# Altium footprint library Udemy_Library.PcbLib: 35 footprints (part 1 of 3)
Each footprint in its own frame and in the unit in brackets; x right, y up, seen from the top. Pads: shape width x height; smd on the part's side, far side on the other; paste and mask are expansions set on the pad; w line width, h text height; cw(c..) or ccw(c..) is an arc to the next point about the centre after c.
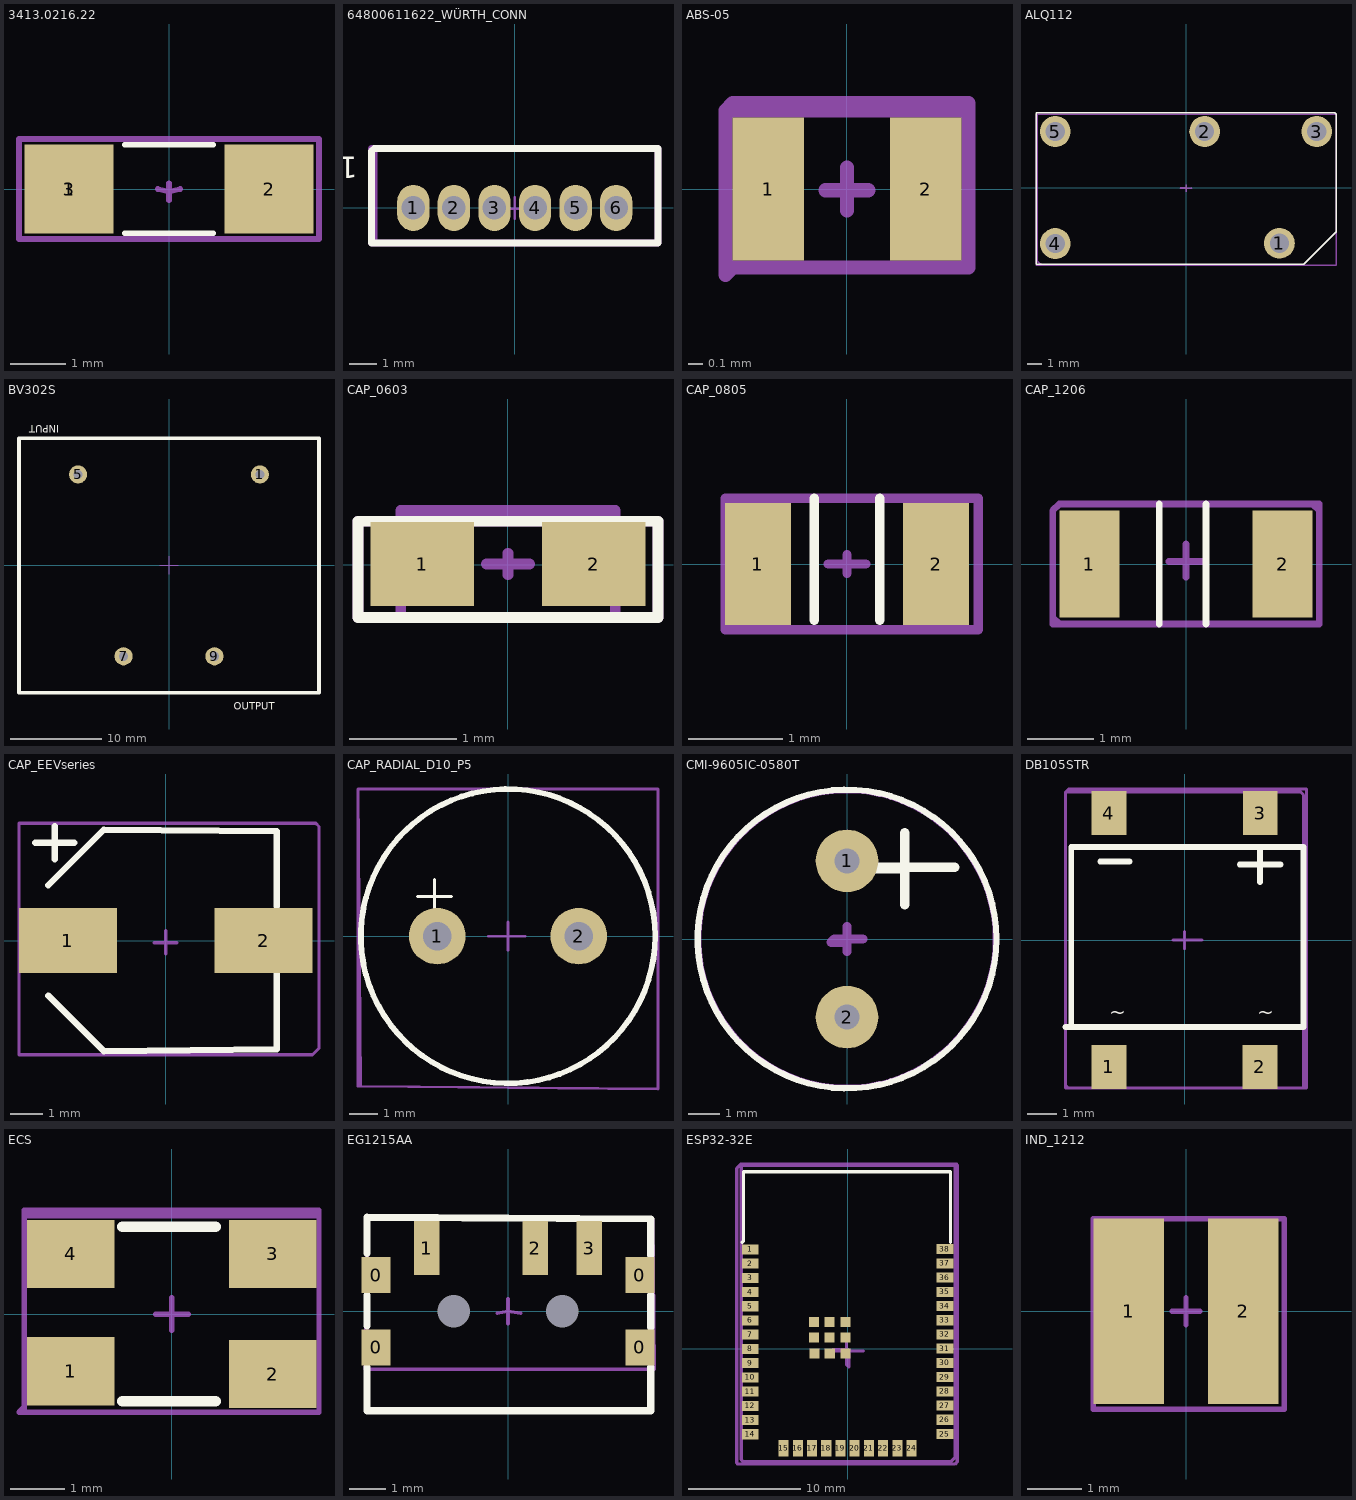
[diagram p0: the footprints below, top view; thin cyan lines are the x and y axes]

## 3413.0216.22 [mm]
pads (3):
  rect 1.6x1.6 smd mask+0.05: 1(-1.8,0) 2(1.8,0)
  rect 0.8x1 all layers, no hole mask+0.05: 3(-1.8,0)
Top Overlay:
  lines w0.1: -0.8,-0.8 0.8,-0.8 ; -0.8,0.8 0.8,0.8
Top Component Center:
  lines w0.1: 0,0.1 0,-0.2 0,-0.05 ; 0.2,0 0,-0.05 ; 0,-0.05 -0.2,0 0,-0.05 ; -2.7,-0.9 -2.7,0.9 2.7,0.9 2.7,-0.9 -2.7,-0.9
Top Designator:
  lines w0.1: -2.7,-0.9 2.7,-0.9 2.7,0.9 -2.7,0.9 -2.7,-0.9
  text ".Designator" at -1.6,-0.333 h0.5
3D body "FUSE-3413.0216.22.STEP": height 0.6, standoff 0, extent -1.6,-0.8 1.6,0.8

## 64800611622_WÜRTH_CONN [mm]
pads (6):
  oval 1.2x1.7 hole 0.87 mask+0.05: 1(-3.75,0) 2(-2.25,0) 3(-0.75,0) 4(0.75,0) 5(2.25,0) 6(3.75,0)
Top Overlay:
  lines w0.25: -5.3,-1.3 -5.3,2.1 -5.2,2.2 5.3,2.2 5.3,-1.3 -5.3,-1.3
  text "1" at -5.8,1.9 h0.8
Top Component Center:
  lines w0.1: -0.394,-0.027 0.406,-0.027 ; 0,-0.4 0,0.4
  lines w0.25: -5.3,-1.3 -5.2,-1.2 -5.2,-0.35 -5.2,1.35 -5.2,2.2 5.3,2.2 5.3,-1.3 -5.3,-1.3
Top Designator:
  lines w0.25: -5.3,-1.3 5.3,-1.3 5.3,2.2 -5.3,2.2 -5.3,-1.3
  text ".Designator" at -2.9,0.767 h0.8
3D body "64800611622 _würth_connector.stp": height 2.25, standoff -4.95, extent -5.25,-1.3 5.25,2.2

## ABS-05 [mm]
pads (2):
  rect 0.5x1 smd mask+0.05: 1(-0.55,0) 2(0.55,0)
Top Component Center:
  lines w0.1: -0.151,-0.01 0.149,-0.01 ; 0,-0.15 0,0.15 ; -0.85,-0.6 -0.85,0.55 0.8,0.55 0.85,0.6 0.85,-0.55 -0.8,-0.55 -0.85,-0.6
Top Designator:
  lines w0.1: -0.85,-0.55 0.85,-0.55 0.85,0.6 -0.8,0.6 -0.85,0.55 -0.85,-0.55
  text ".Designator" at -0.65,0.033 h0.4
3D body "ABS05-32.768KHZ-T.STEP": height 0.5, standoff 0, extent -0.8,-0.5 0.8,0.5

## ALQ112 [mm]
pads (5):
  round 2.1 hole 1.3 mask+0.05: 1(6.35,-3.79) 2(1.27,3.81) 3(8.89,3.81) 4(-8.89,-3.81) 5(-8.89,3.81)
Top Overlay:
  lines w0.1: -10.2,-5.2 -10.2,5.1 10.1,5.1 10.2,5 10.2,-3 8,-5.2 -10.2,-5.2
Top Component Center:
  lines w0.1: 0,0.2 0,-0.3 0,-0.05 ; 0.4,0 0.35,-0.05 0,-0.05 ; 0,-0.05 -0.35,-0.05 -0.4,0 -0.05,0 0,-0.05 ; -10.1,-5 -9.8,-5.3 10.2,-5.3 10.2,5 -10.1,5 -10.1,-5
Top Designator:
  lines w0.1: -10.2,-5.3 10.2,-5.3 10.2,5 -10.1,5 -10.2,4.9 -10.2,-5.3
  text ".Designator" at -0.2,-0.133 h0.5
3D body: height 0.45, standoff -3.75, extent -9.29,-4.21 -8.49,-3.41
3D body: height 0.45, standoff -3.75, extent -9.29,3.41 -8.49,4.21
3D body: height 15.6, standoff 0.4, extent 7.785,-3.44 9.26,-2.94
3D body: height 15.6, standoff 0.4, extent -9.99,-5.09 10.01,4.91
3D body: height 0.2, standoff -4, extent 1.064,3.709 1.476,3.911
3D body: height 0.2, standoff -4, extent 6.144,-3.911 6.556,-3.709
3D body: height 0.2, standoff -4, extent 8.684,3.709 9.096,3.911

## BV302S [mm]
pads (4):
  round 2 hole 1 mask+0.05: 1(10,10) 5(-10,10) 7(-5,-10) 9(5,-10)
Top Overlay:
  lines w0.4: -16.5,-14 -16.5,14 16.5,14 16.5,-14 -16.5,-14
  text "INPUT" at -12.1,15.4 h0.8
  text "OUTPUT" at 7.1,-15.9 h0.8
Top Component Center:
  lines w0.1: 0,1 0,-1 0,0 ; 1,0 0,0 ; 0,0 -1,0 0,0 ; -16.5,-14 16.5,-14 16.5,14 -16.5,14 -16.5,-14
Top Designator:
  lines w0.1: -16.5,-14 16.5,-14 16.5,14 -16.5,14 -16.5,-14
  text ".Designator" at -0.9,-0.633 h0.8
3D body "BV30XXXX028.step": height 29.75, standoff -3.5, extent -16.4,-13.9 16.4,13.9

## CAP_0603 [mil]
pads (2):
  rect 38x31 smd mask+1.97: 1(-31.46,0.21) 2(31.54,0.21)
Top Overlay:
  lines w3.94: -55.08,-19.48 -55.08,15.96 55.16,15.96 55.16,-19.48 -55.08,-19.48
Top 3D Body:
  lines w3.94: -39.33,-19.48 39.41,-19.48 39.41,19.89 -39.33,19.89 -39.33,-19.48
Top Component Center:
  lines w3.94: 0.04,4.14 0.04,-3.73 0.04,0.21 ; 7.91,0.21 0.04,0.21 ; 0.04,0.21 -7.84,0.21 0.04,0.21 ; -55.08,-19.48 -55.08,15.96 55.16,15.96 55.16,-19.48 -55.08,-19.48
Top Designator:
  lines w3.94: -55.08,-19.48 -55.08,15.96 55.16,15.96 55.16,-19.48 -55.08,-19.48
  text ".Designator" at -7.84,-15.54 h11.81
3D body "CAPC0603.STEP": height 31.5, standoff 0, extent -42.14,-21.43 40.57,19.07

## CAP_0805 [mm]
pads (2):
  rect 0.7x1.3 smd mask+0.05: 1(-0.95,0) 2(0.95,0)
Top Overlay:
  lines w0.1: -0.35,-0.6 -0.35,0.7 ; 0.35,-0.6 0.35,0.7
Top Component Center:
  lines w0.1: -0.2,0 0.2,0 0,0 0,-0.1 0,0.1 ; -1.3,-0.7 1.4,-0.7 1.4,0.7 -1.3,0.7 -1.3,-0.7
Top Designator:
  lines w0.1: -1.3,-0.7 1.4,-0.7 1.4,0.7 -1.3,0.7 -1.3,-0.7
  text ".Designator" at -0.8,-0.2 h0.3
3D body "CAPC0805.STEP": height 0.9, standoff 0, extent -1.301,-0.678 1.301,0.678

## CAP_1206 [mm]
pads (2):
  rect 0.9x1.6 smd mask+0.05: 1(-1.45,0) 2(1.45,0)
Top Overlay:
  lines w0.1: -0.4,-0.9 -0.4,0.9 ; 0.3,-0.9 0.3,0.9
Top Component Center:
  lines w0.1: -0.258,0.037 0.242,0.037 ; 0,-0.2 0,0.3 ; -2,-0.8 -2,0.8 -1.9,0.9 1.9,0.9 2,0.8 2,-0.9 -1.9,-0.9 -2,-0.8
Top Designator:
  lines w0.1: -1.9,0.9 -1.9,0.9 ; -1.9,0.9 -2,0.8 -2,-0.9 2,-0.9 2,0.9 -1.9,0.9
  text ".Designator" at -1.7,-0.233 h0.8
3D body "CAPC1206.STEP": height 1.3, standoff -0.01, extent -1.975,-0.976 1.975,0.976

## CAP_EEVseries [mm]
pads (2):
  rect 3x2 smd mask+0.05: 1(-3,0) 2(3,0)
Top Overlay:
  lines w0.2: -4,3 -2.8,3 -3.4,3 ; -3.6,-1.686 -1.9,-3.386 3.4,-3.336 3.4,-1.036 ; -3.6,1.7 -1.9,3.4 3.4,3.35 3.4,1.05 ; -3.4,2.5 -3.4,3 ; -3.4,2.5 -3.4,2.5 ; -3.4,3 -3.4,3.5 ; -3.4,3 -3.4,3.5 ; -3.4,3 -3.4,3 ; -3.4,3.5 -3.4,3.5
Top Component Center:
  lines w0.1: -0.363,-0.068 0.337,-0.068 ; 0,-0.4 0,0.3 ; -4.5,-3.5 4.5,-3.5 4.7,-3.3 4.7,3.3 4.7,3.5 4.6,3.6 -4.5,3.6 -4.5,-3.5
Top Designator:
  lines w0.1: -4.5,-3.5 4.5,-3.5 4.7,-3.3 4.7,3.5 4.6,3.6 -4.5,3.6 -4.5,-3.5
  text ".Designator" at -2.7,-0.933 h0.8
3D body "EEV686M035A9HAA.step": height 8.06, standoff 0.05, extent -3.75,-3.4 3.75,3.4

## CAP_RADIAL_D10_P5 [mm]
pads (2):
  round 2 hole 1 mask+0.05: 1(-2.5,0) 2(2.5,0)
Top Overlay:
  circle w0.2: c0,0 r5.2
  lines w0.1: -3.2,1.4 -2,1.4 -2.6,1.4 ; -2.6,1 -2.6,1.4 ; -2.6,1.4 -2.6,2 -2.6,1.4
Top Component Center:
  lines w0.1: 0,0.5 0,-0.5 0,0 ; 0.6,0 0,0 ; 0,0 -0.7,0 0,0 ; -5.3,5.2 -5.2,-5.3 5.3,-5.4 5.3,5.2 -5.3,5.2
Top Designator:
  lines w0.1: -5.3,-5.3 -5.3,5.2 5.3,5.2 5.3,-5.4 -5.3,-5.3
  text ".Designator" at -2.8,-0.633 h0.8
3D body "ESH477M050AH4AA.step": height 22.2, standoff -19.8, extent -5.25,-5.35 5.25,5.15

## CMI-9605IC-0580T [mm]
pads (2):
  round 2 hole 0.8 mask+0.05: 1(0,2.5) 2(0,-2.5)
Top Overlay:
  circle w0.2: c0,0 r4.78
  lines w0.3: 0.45,2.3 1.8,2.3 1.85,2.25 ; 0.5,2.25 1.85,2.25 ; 1.85,1.1 1.85,3.4 ; 3.45,2.3 1.9,2.3 1.85,2.25
Top Component Center:
  circle w0.1: c0,0 r4.8
  lines w0.3: 0,-0.2 -0.1,-0.1 -0.5,-0.1 -0.4,0 0,0 ; 0,0.4 0,-0.4 0,0 ; 0.5,0 0,0
Top Designator:
  circle w0.2: c0,0 r4.763
  text ".Designator" at -1.2,0.067 h0.5
3D body: height 0.15, standoff -5.35, extent -0.571,1.867 0.629,3.067
3D body: height 5.1, standoff 0.1, extent -4.826,-4.784 4.774,4.816
3D body: height 1.65, standoff -3.85, extent -0.624,-3.049 0.576,-1.849
3D body: height 5.5, standoff 0, extent -0.584,1.938 0.616,3.138
3D body: height 5.5, standoff 0, extent -0.6,1.9 0.6,3.1
3D body: height 5.2, standoff 5.15, extent -4.1,-4 3.9,4

## DB105STR [mm]
pads (4):
  rect 1.2x1.52 smd mask+0.05: 1(-2.605,-4.37) 2(2.595,-4.37) 3(2.605,4.37) 4(-2.605,4.37)
Top Overlay:
  lines w0.2: -4.1,-3 4.1,-3 4.1,3.2 2.025,3.2 -1.725,3.2 -3.9,3.2 -3.9,-3 4,-3 ; -2.9,2.7 -1.9,2.7 ; 1.9,2.6 3.3,2.6 2.6,2.6 ; 2.6,2 2.6,2.6 ; 2.6,2.6 2.6,3.1 2.6,2.6
  text "~" at -2.6,-2.717 h0.5
  text "~" at 2.5,-2.717 h0.5
Top Component Center:
  lines w0.1: -4.05,-5.05 -4.1,-5 ; 0,0.3 0,-0.3 0,0 ; 0.6,0 0,0 ; -4.1,-5 -4.1,-4.5 -4.1,5.1 4,5.1 4.1,5 4.1,-5.1 -4,-5.1 -4.1,-5 ; 0,0 -0.4,0 0,0
Top Designator:
  lines w0.1: -4.1,-5.1 4.2,-5.1 4.2,5.2 -4,5.2 -4.1,5.1 -4.1,-5.1
  text ".Designator" at -0.9,-0.133 h0.5
3D body "DB105STR--3DModel-STEP-269445.STEP": height 2.7, standoff 0, extent -4.075,-4.85 4.075,5.05

## ECS [mm]
pads (4):
  rect 1.6x1.25 smd mask+0.05: 1(-1.85,-1.05) 2(1.85,-1.1) 3(1.85,1.1) 4(-1.85,1.1)
Top Overlay:
  lines w0.2: -0.9,-1.6 0.8,-1.6 ; -0.9,1.6 0.8,1.6
Top Component Center:
  lines w0.1: -0.292,-0.008 0.308,-0.008 ; 0,-0.3 0,0.3 ; -2.8,-1.8 -2.7,-1.7 -2.7,1.8 2.7,1.8 2.7,-1.8 -2.8,-1.8
Top Designator:
  lines w0.1: -2.7,-1.8 2.7,-1.8 2.7,1.9 -2.7,1.9 -2.7,-1.8
  text ".Designator" at -1.5,-0.033 h0.8
3D body "ECS-160-20-30B-TR.STEP": height 0.85, standoff 0, extent -2.5,-1.6 2.5,1.6

## EG1215AA [mm]
pads (9):
  rect 0.8x1 all layers, no hole mask+0.05: 0(-3.65,-1) 0(-3.65,1) 0(3.65,-1) 0(3.65,1)
  round 0 hole 0.9 mask+0.05: 0(-1.5,0) 0(1.501,0.003)
  rect 0.7x1.5 smd mask+0.05: 1(-2.25,1.75) 2(0.75,1.75) 3(2.25,1.75)
Top Overlay:
  lines w0.2: -3.9,-1.55 -3.9,-2.75 3.95,-2.75 3.95,-1.55 ; -3.9,-0.4 -3.9,0.45 ; -3.9,1.6 -3.9,2.6 3.95,2.55 3.95,1.55 ; 3.95,-0.45 3.95,0.45
Top Component Center:
  lines w0.1: 0,0.35 0,-0.35 0,0 ; 0.35,-0.05 0,0 ; 0,0 -0.3,-0.05 0,0 ; -3.95,-1.6 -3.9,1.6 -3.9,2.6 4,2.55 3.95,-1.6 -3.95,-1.6
Top Designator:
  lines w0.1: -3.9,-1.6 4.05,-1.6 4,2.55 -3.9,2.6 -3.9,-1.6
  text ".Designator" at -1.5,-0.033 h0.8
3D body "EG1215AA--3DModel-STEP-1.STEP": height 1.4, standoff -0.3, extent -3.85,-2.75 3.85,2.15

## ESP32-32E [mm]
pads (47):
  rect 1.5x0.9 smd mask+0.05: 1(-8.7,8.87) 2(-8.7,7.6) 3(-8.7,6.33) 4(-8.7,5.06) 5(-8.7,3.79) 6(-8.7,2.52) 7(-8.7,1.25) 8(-8.7,-0.02) 9(-8.7,-1.29) 10(-8.7,-2.56) 11(-8.7,-3.83) 12(-8.7,-5.1) 13(-8.7,-6.37) 14(-8.7,-7.64) 25(8.7,-7.62) 26(8.7,-6.35) 27(8.7,-5.08) 28(8.7,-3.81) 29(8.7,-2.54) 30(8.7,-1.27) 31(8.7,0) 32(8.7,1.27) 33(8.7,2.54) 34(8.7,3.81) 35(8.7,5.08) 36(8.7,6.35) 37(8.7,7.62) 38(8.7,8.89)
  rect 0.9x1.5 smd mask+0.05: 15(-5.712,-8.89) 16(-4.442,-8.89) 17(-3.172,-8.89) 18(-1.902,-8.89) 19(-0.632,-8.89) 20(0.638,-8.89) 21(1.908,-8.89) 22(3.178,-8.89) 23(4.448,-8.89) 24(5.718,-8.89)
  rect 0.9x0.9 smd mask+0.05: ""(-3,2.389) ""(-2.982,1) ""(-2.97,-0.443) ""(-1.6,1) ""(-1.6,2.369) ""(-1.588,-0.443) ""(-0.2,1) ""(-0.2,2.369) ""(-0.188,-0.443)
Top Overlay:
  lines w0.3: -9.4,9.5 -9.3,9.6 -9.3,15.8 -8.3,15.8 ; -8.8,15.8 6.7,15.8 9.2,15.8 9.2,9.5
Top Component Center:
  lines w0.3: -0.1,-0.2 -1.2,-0.2 -1.3,-0.1 0,-0.1 0.1,-0.2 ; -0.1,0 0.1,-0.2 ; -0.1,1 -0.1,-1.4 0.1,-1.6 0.1,-0.2 ; 1.4,-0.2 0.1,-0.2 ; -9.9,-10.2 -9.8,-10.3 9.6,-10.3 9.8,-10.1 9.8,16.4 9.7,16.5 -9.5,16.5 -9.9,16.1 -9.9,-10.2
Top Designator:
  lines w0.3: -9.5,-9.9 -9.3,-10.1 9.2,-10.1 9.6,-9.7 9.6,16.3 9.5,16.4 -9.5,16.4 -9.5,-9.9
  text ".Designator" at -2,1.667 h0.5
3D body "ESP32-WROOM-32E 3D Model.STEP": height 3.2, standoff 0.1, extent -9.1,-9.25 8.9,16.25

## IND_1212 [mm]
pads (2):
  rect 1.3x3.4 smd mask+0.05: 1(-1.05,0) 2(1.05,0)
Top Component Center:
  lines w0.1: -0.25,0 0.25,0 0,0 ; 0,0.002 0,-0.248 0,0.252 ; -1.7,-1.8 1.8,-1.8 1.8,1.7 -1.7,1.7 -1.7,-1.8
Top Designator:
  lines w0.1: -1.7,-1.8 1.8,-1.8 1.8,1.7 -1.7,1.7 -1.7,-1.8
  text ".Designator" at -0.8,-0.333 h0.8
3D body "78438335470.stp": height 1.15, standoff -0.05, extent -1.5,-1.5 1.5,1.5